# Altium footprint library NASCO 3D PCBLIB.PcbLib: 108 footprints (part 3 of 7)
Each footprint in its own frame and in the unit in brackets; x right, y up, seen from the top. Pads: shape width x height; smd on the part's side, far side on the other; paste and mask are expansions set on the pad; w line width, h text height; cw(c..) or ccw(c..) is an arc to the next point about the centre after c.
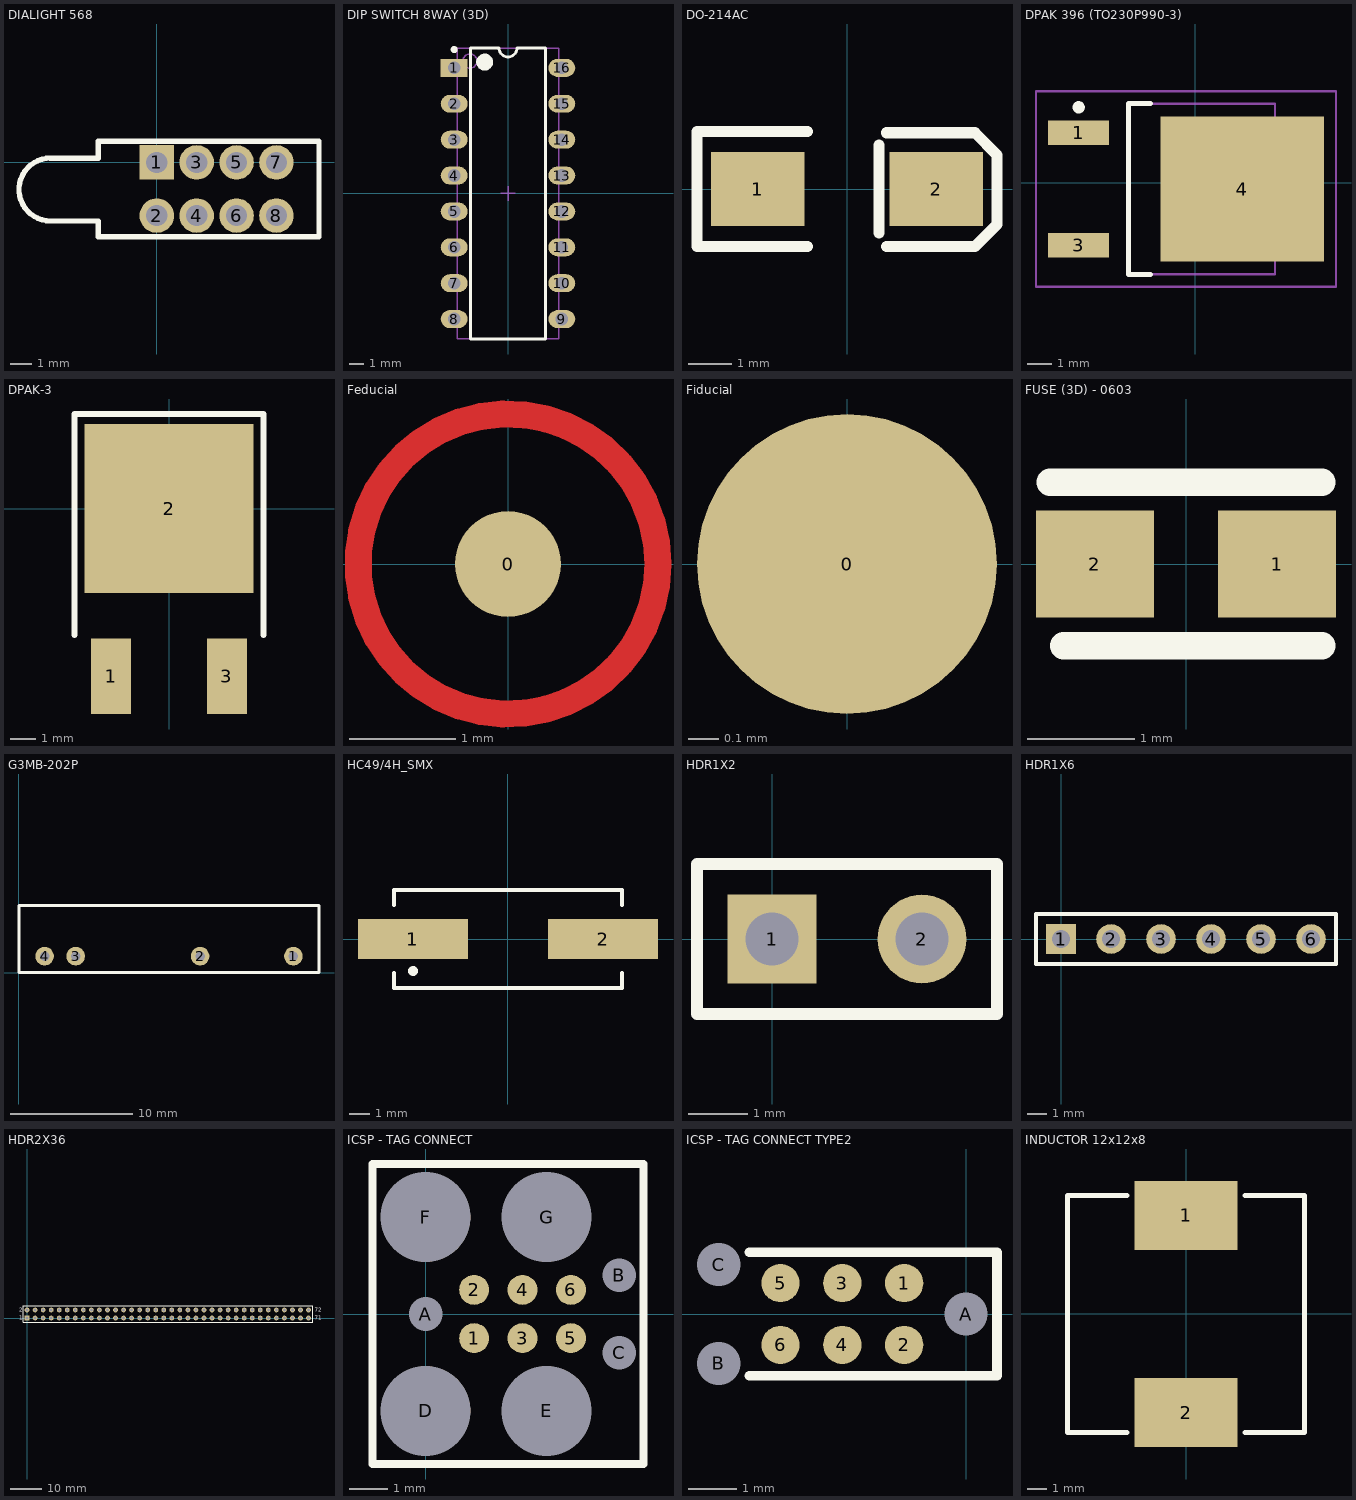
[diagram p2: the footprints below, top view; thin cyan lines are the x and y axes]

## DIALIGHT 568 [mil] "3mm QUAD INDICATOR"
pads (8):
  rect 65x65 hole 40: 1(0,0)
  round 65 hole 40: 2(0,-100) 3(75,0) 4(75,-100) 5(150,0) 6(150,-100) 7(225,0) 8(225,-100)
Top Overlay:
  lines w10: -100,-140 -110,-140 ; -100,40 -110,40 ; -110,-140 -110,-110 ; -110,-140 305,-140 305,40 -110,40 ; -110,-140 -110,-110 ; -110,-110 -200,-110 cw(c-200,-50.94) -200,8.11 -110,8.11 -110,40
3D body: height 800, standoff 0, extent -110,-140 305,40
3D body: height 759.05, standoff 640.94, extent -262.49,-108.8 -145,8.8
3D body: height 559.05, standoff 440.94, extent -262.49,-108.8 -145,8.8
3D body: height 359.06, standoff 240.94, extent -262.49,-108.8 -145,8.8
3D body: height 159.06, standoff 40.94, extent -262.61,-108.75 -145,8.75
3D body: height 158.59, standoff 40.94, extent -200,-108.94 -110,8.94
3D body: height 358.59, standoff 240.94, extent -200,-108.94 -110,8.94
3D body: height 558.59, standoff 440.94, extent -200,-108.94 -110,8.94
3D body: height 758.59, standoff 640.94, extent -200,-108.94 -110,8.94

## DIP SWITCH 8WAY (3D) [mm]
pads (16):
  rect 1.905x1.27 hole 0.9: 1(-3.81,8.89)
  oval 1.905x1.27 hole 0.9: 2(-3.81,6.35) 3(-3.81,3.81) 4(-3.81,1.27) 5(-3.81,-1.27) 6(-3.81,-3.81) 7(-3.81,-6.35) 8(-3.81,-8.89) 9(3.81,-8.89) 10(3.81,-6.35) 11(3.81,-3.81) 12(3.81,-1.27) 13(3.81,1.27) 14(3.81,3.81) 15(3.81,6.35) 16(3.81,8.89)
Top Overlay:
  circle w0.6: c-1.65,9.3 r0.3
  circle w0.25: c-3.81,10.19 r0.125
  lines w0.2: -2.65,-10.3 2.65,-10.3 2.65,10.3 0.635,10.3 cw(c0,10.3) -0.635,10.3 -2.65,10.3 -2.65,-10.3
Mechanical 13:
  circle w0.1: c-2.7,9.375 r0.5
  lines w0.1: -3.6,-10.275 3.6,-10.275 3.6,10.275 -3.6,10.275 -3.6,-10.275
Mechanical 15:
  lines w0.1: -0.5,0 0.5,0 ; 0,-0.5 0,0.5
3D body: height 4.41, standoff 0, extent -0.01,-9.53 1.49,-8.28
3D body: height 4.41, standoff 0, extent -0.01,-6.99 1.49,-5.74
3D body: height 4.41, standoff 0, extent -0.01,-4.45 1.49,-3.2
3D body: height 4.41, standoff 0, extent -0.01,-1.91 1.49,-0.66
3D body: height 4.41, standoff 0, extent -0.01,0.63 1.49,1.88
3D body: height 4.41, standoff 0, extent -0.01,3.17 1.49,4.42
3D body: height 4.41, standoff 0, extent -0.01,5.71 1.49,6.96
3D body: height 4.41, standoff 0, extent -0.01,8.25 1.49,9.5
3D body: height 5, standoff 0, extent -1.76,-9.53 -0.01,-8.28
3D body: height 5, standoff 0, extent -1.76,-6.99 -0.01,-5.74
3D body: height 5, standoff 0, extent -1.76,-4.45 -0.01,-3.2
3D body: height 5, standoff 0, extent -1.76,-1.91 -0.01,-0.66
3D body: height 5, standoff 0, extent -1.76,0.63 -0.01,1.88
3D body: height 5, standoff 0, extent -1.76,3.17 -0.01,4.42
3D body: height 5, standoff 0, extent -1.76,5.71 -0.01,6.96
3D body: height 5, standoff 0, extent -1.76,8.25 -0.01,9.5
3D body: height 4.4, standoff 0, extent -4.01,-10.75 3.99,10.75

## DO-214AC [mil]
pads (2):
  rect 85x67 smd: 1(-81,0) 2(81,0)
Top Overlay:
  lines w10: -36,-52 -136,-52 -136,52 -36,52 ; 29,-40 29,40 ; 36,-52 116,-52 136,-32 ; 36,51 116,51 136,31 136,-31
3D body: height 11.81, standoff 0, extent -78.74,-23.62 -55.12,23.62
3D body: height 11.81, standoff 0, extent 55.12,-23.62 78.74,23.62
3D body: height 61.02, standoff 0, extent 39.37,-39.37 49.21,39.37
3D body: height 59.06, standoff 0, extent -59.06,-39.37 59.06,39.37

## DPAK 396 (TO230P990-3) [mm]
pads (3):
  rect 2.5x1 smd: 1(-4.781,2.046) 3(-4.781,-2.554)
  rect 6.7x5.95 smd: 4(1.919,-0.254)
Top Overlay:
  circle w0.25: c-4.781,3.096 r0.125
  lines w0.2: -1.831,-3.754 -2.731,-3.754 -2.731,3.246 -1.831,3.246
Mechanical 13:
  lines w0.1: -2.731,-3.754 -2.731,3.246 3.269,3.246 3.269,-3.754 -2.731,-3.754
Mechanical 15:
  lines w0.1: -0.881,-0.254 0.119,-0.254 ; -0.381,-0.754 -0.381,0.246 ; -6.531,-4.254 -6.531,3.746 5.769,3.746 5.769,-4.254 -6.531,-4.254
3D body "User Library-SO-369A-13.step": height 2.4, standoff 0, extent -5.819,-3.554 4.281,3.046

## DPAK-3 [mm]
pads (3):
  rect 1.6x3 smd: 1(-2.3,-6.65) 3(2.3,-6.65)
  rect 6.7x6.7 smd: 2(0,0)
Top Overlay:
  lines w0.254: -3.75,-5 -3.75,3.75 3.75,3.75 3.75,-5
3D body "User Library-TO252AA.STEP": height 2.3, standoff -0.01, extent -3.302,-6.882 3.278,2.818

## Feducial [mm]
pads (1):
  round 1 smd mask+1: 0(0,0)
Top Layer:
  circle w0.254: c0,0 r1.414

## Fiducial [mm]
pads (1):
  round 1 smd mask+1: 0(0,0)

## FUSE (3D) - 0603 [mm]
height 0.025
pads (2):
  rect 1.1x1 smd: 1(0.85,0) 2(-0.85,0)
Top Overlay:
  lines w0.254: -1.27,0.762 1.27,0.762 ; -1.143,-0.762 1.27,-0.762
3D body: height 0.92, standoff 0, extent -0.8,-0.4 -0.5,0.4
3D body: height 0.92, standoff 0, extent 0.5,-0.4 0.8,0.4
3D body: height 0.92, standoff 0, extent -0.5,-0.4 0.5,0.4

## G3MB-202P [mil]
height 757.87
pads (4):
  round 60 hole 30: 1(882.28,53.15) 2(582.28,53.15) 3(182.28,53.15) 4(82.28,53.15)
Top Overlay:
  lines w10: 0,0 0,216.54 964.57,216.54 964.57,0 0,0

## HC49/4H_SMX [mm] "Quartz Crystal, SM; Body 13.4 (inc. leads) x 4.9 mm (LxW max)"
height 4.3
pads (2):
  rect 5.5x2 smd: 1(-4.75,0) 2(4.75,0)
Top Overlay:
  circle w0.25: c-4.75,-1.6 r0.125
  lines w0.2: -5.7,-1.7 -5.7,-2.45 5.7,-2.45 5.7,-1.7 ; -5.7,1.7 -5.7,2.45 5.7,2.45 5.7,1.7
3D body "User Library-HC49US.STEP": height 4.2, standoff 0, extent -6.365,-2.35 6.335,2.35

## HDR1X2 [mm] "Connector; Header; 2 Position"
pads (2):
  rect 1.5x1.5 hole 0.9: 1(0,0)
  round 1.5 hole 0.9: 2(2.54,0)
Top Overlay:
  lines w0.2: -1.27,-1.27 -1.27,1.27 3.81,1.27 3.81,-1.27 -1.27,-1.27

## HDR1X6 [mm] "Connector; Header; 6 Position"
pads (6):
  rect 1.5x1.5 hole 0.9: 1(0,0)
  round 1.5 hole 0.9: 2(2.54,0) 3(5.08,0) 4(7.62,0) 5(10.16,0) 6(12.7,0)
Top Overlay:
  lines w0.2: -1.27,-1.27 13.97,-1.27 13.97,1.27 -1.27,1.27 -1.27,-1.27

## HDR2X36 [mm] "Connector; Header; 36x2 Position"
pads (72):
  rect 1.5x1.5 hole 0.9: 1(0,0)
  round 1.5 hole 0.9: 2(0,2.54) 3(2.54,0) 4(2.54,2.54) 5(5.08,0) 6(5.08,2.54) 7(7.62,0) 8(7.62,2.54) 9(10.16,0) 10(10.16,2.54) 11(12.7,0) 12(12.7,2.54) 13(15.24,0) 14(15.24,2.54) 15(17.78,0) 16(17.78,2.54) 17(20.32,0) 18(20.32,2.54) 19(22.86,0) 20(22.86,2.54) 21(25.4,0) 22(25.4,2.54) 23(27.94,0) 24(27.94,2.54) 25(30.48,0) 26(30.48,2.54) 27(33.02,0) 28(33.02,2.54) 29(35.56,0) 30(35.56,2.54) 31(38.1,0) 32(38.1,2.54) 33(40.64,0) 34(40.64,2.54) 35(43.18,0) 36(43.18,2.54) 37(45.72,0) 38(45.72,2.54) 39(48.26,0) 40(48.26,2.54) 41(50.8,0) 42(50.8,2.54) 43(53.34,0) 44(53.34,2.54) 45(55.88,0) 46(55.88,2.54) 47(58.42,0) 48(58.42,2.54) 49(60.96,0) 50(60.96,2.54) 51(63.5,0) 52(63.5,2.54) 53(66.04,0) 54(66.04,2.54) 55(68.58,0) 56(68.58,2.54) 57(71.12,0) 58(71.12,2.54) 59(73.66,0) 60(73.66,2.54) 61(76.2,0) 62(76.2,2.54) 63(78.74,0) 64(78.74,2.54) 65(81.28,0) 66(81.28,2.54) 67(83.82,0) 68(83.82,2.54) 69(86.36,0) 70(86.36,2.54) 71(88.9,0) 72(88.9,2.54)
Top Overlay:
  lines w0.2: -1.27,-1.27 -1.27,3.81 90.3,3.81 90.3,-1.27 -1.27,-1.27
  text "2" at -2.54,2.032 h1.27
  text "1" at -2.54,-0.508 h1.27
  text "71" at 90.932,-0.508 h1.27
  text "72" at 90.932,2.032 h1.27
Bottom Overlay:
  text "1" at -55.88,-0.508 h1.27

## ICSP - TAG CONNECT [mil] "ICSP - TAG CONNECT"
height 27.95
pads (13):
  round 31 smd paste-40: 1(50,-25) 2(50,25) 3(100,-25) 4(100,25) 5(150,-25) 6(150,25)
  round 34 hole 35 unplated: A(0,0) B(200,40) C(200,-40)
  round 92 hole 93 unplated: D(0,-100) E(125,-100) F(0,100) G(125,100)
Top Overlay:
  lines w7.87: -55,-155 -55,155 225,155 225,-155 -55,-155

## ICSP - TAG CONNECT TYPE2 [mil] "ICSP - TAG CONNECT - TYPE 2"
height 51.18
pads (9):
  round 31 smd paste-40: 1(-50,25) 2(-50,-25) 3(-100,25) 4(-100,-25) 5(-150,25) 6(-150,-25)
  round 34 hole 35 unplated: A(0,0) B(-200,-40) C(-200,40)
Top Overlay:
  lines w7.87: -175,-50 25,-50 25,50 -175,50

## INDUCTOR 12x12x8 [mm]
pads (2):
  rect 5.2x3.5 smd: 1(0,5) 2(0,-5)
Top Overlay:
  lines w0.254: -3,-6 -6,-6 -6,6 -3,6 ; 3,-6 6,-6 6,6 3,6
3D body "WE-PD_1280_Metal.stp": height 8.02, standoff 0.02, extent -6,-6 6,6